# Altium schematic symbol library jlcpcb_2025_04_capacitors_extended_0603.schlib: 3668 symbols (part 7 of 20) (continued)
## C1608NP0100JGTS
designator C?  Capacitance: 10pF  (hidden comment: *)
Capacitor, Ceramic (MLCC), 10pF, ±5%, 50V, NP0, ±5%, SMD 0603; Manufacturer: Darfon Elec; Manufacturer Part Number: C1608NP0100JGTS; Package Size: 0603; JLCPCB Basic Part: No; JLCPCB Part Number: C718539; Supplier 1: LCSC; Category: Capacitors - MLCC; Supplier Part Number 1: C718539; Tolerance: ±5%; Voltage Rating: 50V; Temperature Coefficient: NP0; RoHS: Yes; ComponentLink1Description: Datasheet; ComponentLink1URL: https://wmsc.lcsc.com/wmsc/upload/file/pdf/v2/lcsc/2304140030_Darfon-Elec-C1608NP0100JGTS_C718539.pdf; ComponentLink2Description: JLCPCB Part URL; ComponentLink2URL: https://jlcpcb.com/partdetail/C718539; ComponentLink3Description: LCSC Part URL; ComponentLink3URL: https://lcsc.com/product-detail/Multilayer-Ceramic-Capacitors-MLCC---SMD-SMT_Darfon-Elec-Darfon-Elec-C1608NP0100JGTS_C718539.html
footprint CAP-0603 (0603 (1608M) Capacitor)
pins: 1, 2

## C1608NP0102JHTS
designator C?  Capacitance: 1nF  (hidden comment: *)
Capacitor, Ceramic (MLCC), 1nF, ±5%, 100V, NP0, ±5%, SMD 0603; Manufacturer: Darfon Elec; Manufacturer Part Number: C1608NP0102JHTS; Package Size: 0603; JLCPCB Basic Part: No; JLCPCB Part Number: C725590; Supplier 1: LCSC; Category: Capacitors - MLCC; Supplier Part Number 1: C725590; Tolerance: ±5%; Voltage Rating: 100V; Temperature Coefficient: NP0; RoHS: Yes; ComponentLink1Description: Datasheet; ComponentLink1URL: https://wmsc.lcsc.com/wmsc/upload/file/pdf/v2/lcsc/2304140030_Darfon-Elec-C1608NP0102JHTS_C725590.pdf; ComponentLink2Description: JLCPCB Part URL; ComponentLink2URL: https://jlcpcb.com/partdetail/C725590; ComponentLink3Description: LCSC Part URL; ComponentLink3URL: https://lcsc.com/product-detail/Multilayer-Ceramic-Capacitors-MLCC---SMD-SMT_Darfon-Elec-Darfon-Elec-C1608NP0102JHTS_C725590.html
footprint CAP-0603 (0603 (1608M) Capacitor)
pins: 1, 2

## C1608NP0120JGTS
designator C?  Capacitance: 12pF  (hidden comment: *)
Capacitor, Ceramic (MLCC), 12pF, ±5%, 50V, NP0, ±5%, SMD 0603; Manufacturer: Darfon Elec; Manufacturer Part Number: C1608NP0120JGTS; Package Size: 0603; JLCPCB Basic Part: No; JLCPCB Part Number: C718564; Supplier 1: LCSC; Category: Capacitors - MLCC; Supplier Part Number 1: C718564; Tolerance: ±5%; Voltage Rating: 50V; Temperature Coefficient: NP0; RoHS: Yes; ComponentLink1Description: Datasheet; ComponentLink1URL: https://wmsc.lcsc.com/wmsc/upload/file/pdf/v2/lcsc/2304140030_Darfon-Elec-C1608NP0120JGTS_C718564.pdf; ComponentLink2Description: JLCPCB Part URL; ComponentLink2URL: https://jlcpcb.com/partdetail/C718564; ComponentLink3Description: LCSC Part URL; ComponentLink3URL: https://lcsc.com/product-detail/Multilayer-Ceramic-Capacitors-MLCC---SMD-SMT_Darfon-Elec-Darfon-Elec-C1608NP0120JGTS_C718564.html
footprint CAP-0603 (0603 (1608M) Capacitor)
pins: 1, 2

## C1608NP0121JGTS
designator C?  Capacitance: 120pF  (hidden comment: *)
Capacitor, Ceramic (MLCC), 120pF, ±5%, 50V, NP0, ±5%, SMD 0603; Manufacturer: Darfon Elec; Manufacturer Part Number: C1608NP0121JGTS; Package Size: 0603; JLCPCB Basic Part: No; JLCPCB Part Number: C561174; Supplier 1: LCSC; Category: Capacitors - MLCC; Supplier Part Number 1: C561174; Tolerance: ±5%; Voltage Rating: 50V; Temperature Coefficient: NP0; RoHS: Yes; ComponentLink1Description: Datasheet; ComponentLink1URL: https://wmsc.lcsc.com/wmsc/upload/file/pdf/v2/lcsc/2006011904_Darfon-Elec-C1608NP0121JGTS_C561174.pdf; ComponentLink2Description: JLCPCB Part URL; ComponentLink2URL: https://jlcpcb.com/partdetail/C561174; ComponentLink3Description: LCSC Part URL; ComponentLink3URL: https://lcsc.com/product-detail/Multilayer-Ceramic-Capacitors-MLCC---SMD-SMT_Darfon-Elec-Darfon-Elec-C1608NP0121JGTS_C561174.html
footprint CAP-0603 (0603 (1608M) Capacitor)
pins: 1, 2

## C1608NP0122JGT
designator C?  Capacitance: 1.2nF  (hidden comment: *)
Capacitor, Ceramic (MLCC), 1.2nF, ±5%, 50V, NP0, ±5%, SMD 0603; Manufacturer: Darfon Elec; Manufacturer Part Number: C1608NP0122JGT; Package Size: 0603; JLCPCB Basic Part: No; JLCPCB Part Number: C359297; Supplier 1: LCSC; Category: Capacitors - MLCC; Supplier Part Number 1: C359297; Tolerance: ±5%; Voltage Rating: 50V; Temperature Coefficient: NP0; RoHS: Yes; ComponentLink1Description: Datasheet; ComponentLink1URL: https://wmsc.lcsc.com/wmsc/upload/file/pdf/v2/lcsc/2304140030_Darfon-Elec-C1608NP0122JGT_C359297.pdf; ComponentLink2Description: JLCPCB Part URL; ComponentLink2URL: https://jlcpcb.com/partdetail/C359297; ComponentLink3Description: LCSC Part URL; ComponentLink3URL: https://lcsc.com/product-detail/Multilayer-Ceramic-Capacitors-MLCC---SMD-SMT_Darfon-Elec-Darfon-Elec-C1608NP0122JGT_C359297.html
footprint CAP-0603 (0603 (1608M) Capacitor)
pins: 1, 2

## C1608NP0129CGTS
designator C?  Capacitance: 1.2pF  (hidden comment: *)
Capacitor, Ceramic (MLCC), 1.2pF, 50V, NP0, SMD 0603; Manufacturer: Darfon Elec; Manufacturer Part Number: C1608NP0129CGTS; Package Size: 0603; JLCPCB Basic Part: No; JLCPCB Part Number: C561161; Supplier 1: LCSC; Category: Capacitors - MLCC; Supplier Part Number 1: C561161; Voltage Rating: 50V; Temperature Coefficient: NP0; RoHS: Yes; ComponentLink1Description: Datasheet; ComponentLink1URL: https://wmsc.lcsc.com/wmsc/upload/file/pdf/v2/lcsc/2304140030_Darfon-Elec-C1608NP0129CGTS_C561161.pdf; ComponentLink2Description: JLCPCB Part URL; ComponentLink2URL: https://jlcpcb.com/partdetail/C561161; ComponentLink3Description: LCSC Part URL; ComponentLink3URL: https://lcsc.com/product-detail/Multilayer-Ceramic-Capacitors-MLCC---SMD-SMT_Darfon-Elec-Darfon-Elec-C1608NP0129CGTS_C561161.html
footprint CAP-0603 (0603 (1608M) Capacitor)
pins: 1, 2

## C1608NP0180JGTS
designator C?  Capacitance: 18pF  (hidden comment: *)
Capacitor, Ceramic (MLCC), 18pF, ±5%, 50V, NP0, ±5%, SMD 0603; Manufacturer: Darfon Elec; Manufacturer Part Number: C1608NP0180JGTS; Package Size: 0603; JLCPCB Basic Part: No; JLCPCB Part Number: C561171; Supplier 1: LCSC; Category: Capacitors - MLCC; Supplier Part Number 1: C561171; Tolerance: ±5%; Voltage Rating: 50V; Temperature Coefficient: NP0; RoHS: Yes; ComponentLink1Description: Datasheet; ComponentLink1URL: https://wmsc.lcsc.com/wmsc/upload/file/pdf/v2/lcsc/2006011904_Darfon-Elec-C1608NP0180JGTS_C561171.pdf; ComponentLink2Description: JLCPCB Part URL; ComponentLink2URL: https://jlcpcb.com/partdetail/C561171; ComponentLink3Description: LCSC Part URL; ComponentLink3URL: https://lcsc.com/product-detail/Multilayer-Ceramic-Capacitors-MLCC---SMD-SMT_Darfon-Elec-Darfon-Elec-C1608NP0180JGTS_C561171.html
footprint CAP-0603 (0603 (1608M) Capacitor)
pins: 1, 2

## C1608NP0189CGTS
designator C?  Capacitance: 1.8pF  (hidden comment: *)
Capacitor, Ceramic (MLCC), 1.8pF, 50V, NP0, SMD 0603; Manufacturer: Darfon Elec; Manufacturer Part Number: C1608NP0189CGTS; Package Size: 0603; JLCPCB Basic Part: No; JLCPCB Part Number: C561162; Supplier 1: LCSC; Category: Capacitors - MLCC; Supplier Part Number 1: C561162; Voltage Rating: 50V; Temperature Coefficient: NP0; RoHS: Yes; ComponentLink1Description: Datasheet; ComponentLink1URL: https://wmsc.lcsc.com/wmsc/upload/file/pdf/v2/lcsc/2304140030_Darfon-Elec-C1608NP0189CGTS_C561162.pdf; ComponentLink2Description: JLCPCB Part URL; ComponentLink2URL: https://jlcpcb.com/partdetail/C561162; ComponentLink3Description: LCSC Part URL; ComponentLink3URL: https://lcsc.com/product-detail/Multilayer-Ceramic-Capacitors-MLCC---SMD-SMT_Darfon-Elec-Darfon-Elec-C1608NP0189CGTS_C561162.html
footprint CAP-0603 (0603 (1608M) Capacitor)
pins: 1, 2

## C1608NP0220JGTS
designator C?  Capacitance: 22pF  (hidden comment: *)
Capacitor, Ceramic (MLCC), 22pF, ±5%, 50V, NP0, ±5%, SMD 0603; Manufacturer: Darfon Elec; Manufacturer Part Number: C1608NP0220JGTS; Package Size: 0603; JLCPCB Basic Part: No; JLCPCB Part Number: C561172; Supplier 1: LCSC; Category: Capacitors - MLCC; Supplier Part Number 1: C561172; Tolerance: ±5%; Voltage Rating: 50V; Temperature Coefficient: NP0; RoHS: Yes; ComponentLink1Description: Datasheet; ComponentLink1URL: https://wmsc.lcsc.com/wmsc/upload/file/pdf/v2/lcsc/2006011904_Darfon-Elec-C1608NP0220JGTS_C561172.pdf; ComponentLink2Description: JLCPCB Part URL; ComponentLink2URL: https://jlcpcb.com/partdetail/C561172; ComponentLink3Description: LCSC Part URL; ComponentLink3URL: https://lcsc.com/product-detail/Multilayer-Ceramic-Capacitors-MLCC---SMD-SMT_Darfon-Elec-Darfon-Elec-C1608NP0220JGTS_C561172.html
footprint CAP-0603 (0603 (1608M) Capacitor)
pins: 1, 2

## C1608NP0249CGTS
designator C?  Capacitance: 2.4pF  (hidden comment: *)
Capacitor, Ceramic (MLCC), 2.4pF, 50V, NP0, SMD 0603; Manufacturer: Darfon Elec; Manufacturer Part Number: C1608NP0249CGTS; Package Size: 0603; JLCPCB Basic Part: No; JLCPCB Part Number: C561163; Supplier 1: LCSC; Category: Capacitors - MLCC; Supplier Part Number 1: C561163; Voltage Rating: 50V; Temperature Coefficient: NP0; RoHS: Yes; ComponentLink1Description: Datasheet; ComponentLink1URL: https://wmsc.lcsc.com/wmsc/upload/file/pdf/v2/lcsc/2304140030_Darfon-Elec-C1608NP0249CGTS_C561163.pdf; ComponentLink2Description: JLCPCB Part URL; ComponentLink2URL: https://jlcpcb.com/partdetail/C561163; ComponentLink3Description: LCSC Part URL; ComponentLink3URL: https://lcsc.com/product-detail/Multilayer-Ceramic-Capacitors-MLCC---SMD-SMT_Darfon-Elec-Darfon-Elec-C1608NP0249CGTS_C561163.html
footprint CAP-0603 (0603 (1608M) Capacitor)
pins: 1, 2

## C1608NP0330JGTS
designator C?  Capacitance: 33pF  (hidden comment: *)
Capacitor, Ceramic (MLCC), 33pF, ±5%, 50V, NP0, ±5%, SMD 0603; Manufacturer: Darfon Elec; Manufacturer Part Number: C1608NP0330JGTS; Package Size: 0603; JLCPCB Basic Part: No; JLCPCB Part Number: C561173; Supplier 1: LCSC; Category: Capacitors - MLCC; Supplier Part Number 1: C561173; Tolerance: ±5%; Voltage Rating: 50V; Temperature Coefficient: NP0; RoHS: Yes; ComponentLink1Description: Datasheet; ComponentLink1URL: https://wmsc.lcsc.com/wmsc/upload/file/pdf/v2/lcsc/2006011904_Darfon-Elec-C1608NP0330JGTS_C561173.pdf; ComponentLink2Description: JLCPCB Part URL; ComponentLink2URL: https://jlcpcb.com/partdetail/C561173; ComponentLink3Description: LCSC Part URL; ComponentLink3URL: https://lcsc.com/product-detail/Multilayer-Ceramic-Capacitors-MLCC---SMD-SMT_Darfon-Elec-Darfon-Elec-C1608NP0330JGTS_C561173.html
footprint CAP-0603 (0603 (1608M) Capacitor)
pins: 1, 2

## C1608NP0339CGTS
designator C?  Capacitance: 3.3pF  (hidden comment: *)
Capacitor, Ceramic (MLCC), 3.3pF, 50V, NP0, SMD 0603; Manufacturer: Darfon Elec; Manufacturer Part Number: C1608NP0339CGTS; Package Size: 0603; JLCPCB Basic Part: No; JLCPCB Part Number: C561165; Supplier 1: LCSC; Category: Capacitors - MLCC; Supplier Part Number 1: C561165; Voltage Rating: 50V; Temperature Coefficient: NP0; RoHS: Yes; ComponentLink1Description: Datasheet; ComponentLink1URL: https://wmsc.lcsc.com/wmsc/upload/file/pdf/v2/lcsc/2304140030_Darfon-Elec-C1608NP0339CGTS_C561165.pdf; ComponentLink2Description: JLCPCB Part URL; ComponentLink2URL: https://jlcpcb.com/partdetail/C561165; ComponentLink3Description: LCSC Part URL; ComponentLink3URL: https://lcsc.com/product-detail/Multilayer-Ceramic-Capacitors-MLCC---SMD-SMT_Darfon-Elec-Darfon-Elec-C1608NP0339CGTS_C561165.html
footprint CAP-0603 (0603 (1608M) Capacitor)
pins: 1, 2

## C1608NP0399CGTS
designator C?  Capacitance: 3.9pF  (hidden comment: *)
Capacitor, Ceramic (MLCC), 3.9pF, 50V, NP0, SMD 0603; Manufacturer: Darfon Elec; Manufacturer Part Number: C1608NP0399CGTS; Package Size: 0603; JLCPCB Basic Part: No; JLCPCB Part Number: C561166; Supplier 1: LCSC; Category: Capacitors - MLCC; Supplier Part Number 1: C561166; Voltage Rating: 50V; Temperature Coefficient: NP0; RoHS: Yes; ComponentLink1Description: Datasheet; ComponentLink1URL: https://wmsc.lcsc.com/wmsc/upload/file/pdf/v2/lcsc/2304140030_Darfon-Elec-C1608NP0399CGTS_C561166.pdf; ComponentLink2Description: JLCPCB Part URL; ComponentLink2URL: https://jlcpcb.com/partdetail/C561166; ComponentLink3Description: LCSC Part URL; ComponentLink3URL: https://lcsc.com/product-detail/Multilayer-Ceramic-Capacitors-MLCC---SMD-SMT_Darfon-Elec-Darfon-Elec-C1608NP0399CGTS_C561166.html
footprint CAP-0603 (0603 (1608M) Capacitor)
pins: 1, 2

## C1608NP0470JGTS
designator C?  Capacitance: 47pF  (hidden comment: *)
Capacitor, Ceramic (MLCC), 47pF, ±5%, 50V, NP0, ±5%, SMD 0603; Manufacturer: Darfon Elec; Manufacturer Part Number: C1608NP0470JGTS; Package Size: 0603; JLCPCB Basic Part: No; JLCPCB Part Number: C725574; Supplier 1: LCSC; Category: Capacitors - MLCC; Supplier Part Number 1: C725574; Tolerance: ±5%; Voltage Rating: 50V; Temperature Coefficient: NP0; RoHS: Yes; ComponentLink1Description: Datasheet; ComponentLink1URL: https://wmsc.lcsc.com/wmsc/upload/file/pdf/v2/lcsc/2304140030_Darfon-Elec-C1608NP0470JGTS_C725574.pdf; ComponentLink2Description: JLCPCB Part URL; ComponentLink2URL: https://jlcpcb.com/partdetail/C725574; ComponentLink3Description: LCSC Part URL; ComponentLink3URL: https://lcsc.com/product-detail/Multilayer-Ceramic-Capacitors-MLCC---SMD-SMT_Darfon-Elec-Darfon-Elec-C1608NP0470JGTS_C725574.html
footprint CAP-0603 (0603 (1608M) Capacitor)
pins: 1, 2

## C1608NP0509DGTS
designator C?  Capacitance: 5pF  (hidden comment: *)
Capacitor, Ceramic (MLCC), 5pF, 50V, NP0, SMD 0603; Manufacturer: Darfon Elec; Manufacturer Part Number: C1608NP0509DGTS; Package Size: 0603; JLCPCB Basic Part: No; JLCPCB Part Number: C561167; Supplier 1: LCSC; Category: Capacitors - MLCC; Supplier Part Number 1: C561167; Voltage Rating: 50V; Temperature Coefficient: NP0; RoHS: Yes; ComponentLink1Description: Datasheet; ComponentLink1URL: https://wmsc.lcsc.com/wmsc/upload/file/pdf/v2/lcsc/2006011904_Darfon-Elec-C1608NP0509DGTS_C561167.pdf; ComponentLink2Description: JLCPCB Part URL; ComponentLink2URL: https://jlcpcb.com/partdetail/C561167; ComponentLink3Description: LCSC Part URL; ComponentLink3URL: https://lcsc.com/product-detail/Multilayer-Ceramic-Capacitors-MLCC---SMD-SMT_Darfon-Elec-Darfon-Elec-C1608NP0509DGTS_C561167.html
footprint CAP-0603 (0603 (1608M) Capacitor)
pins: 1, 2

## C1608NP0569DGTS
designator C?  Capacitance: 5.6pF  (hidden comment: *)
Capacitor, Ceramic (MLCC), 5.6pF, 50V, NP0, SMD 0603; Manufacturer: Darfon Elec; Manufacturer Part Number: C1608NP0569DGTS; Package Size: 0603; JLCPCB Basic Part: No; JLCPCB Part Number: C561168; Supplier 1: LCSC; Category: Capacitors - MLCC; Supplier Part Number 1: C561168; Voltage Rating: 50V; Temperature Coefficient: NP0; RoHS: Yes; ComponentLink1Description: Datasheet; ComponentLink1URL: https://wmsc.lcsc.com/wmsc/upload/file/pdf/v2/lcsc/2006011904_Darfon-Elec-C1608NP0569DGTS_C561168.pdf; ComponentLink2Description: JLCPCB Part URL; ComponentLink2URL: https://jlcpcb.com/partdetail/C561168; ComponentLink3Description: LCSC Part URL; ComponentLink3URL: https://lcsc.com/product-detail/Multilayer-Ceramic-Capacitors-MLCC---SMD-SMT_Darfon-Elec-Darfon-Elec-C1608NP0569DGTS_C561168.html
footprint CAP-0603 (0603 (1608M) Capacitor)
pins: 1, 2

## C1608NP0681JGT
designator C?  Capacitance: 680pF  (hidden comment: *)
Capacitor, Ceramic (MLCC), 680pF, ±5%, 50V, NP0, ±5%, SMD 0603; Manufacturer: Darfon Elec; Manufacturer Part Number: C1608NP0681JGT; Package Size: 0603; JLCPCB Basic Part: No; JLCPCB Part Number: C359306; Supplier 1: LCSC; Category: Capacitors - MLCC; Supplier Part Number 1: C359306; Tolerance: ±5%; Voltage Rating: 50V; Temperature Coefficient: NP0; RoHS: Yes; ComponentLink1Description: Datasheet; ComponentLink1URL: https://wmsc.lcsc.com/wmsc/upload/file/pdf/v2/lcsc/2304140030_Darfon-Elec-C1608NP0681JGT_C359306.pdf; ComponentLink2Description: JLCPCB Part URL; ComponentLink2URL: https://jlcpcb.com/partdetail/C359306; ComponentLink3Description: LCSC Part URL; ComponentLink3URL: https://lcsc.com/product-detail/Multilayer-Ceramic-Capacitors-MLCC---SMD-SMT_Darfon-Elec-Darfon-Elec-C1608NP0681JGT_C359306.html
footprint CAP-0603 (0603 (1608M) Capacitor)
pins: 1, 2

## C1608X5R0G156MT000N
designator C?  Capacitance: 15uF  (hidden comment: *)
Capacitor, Ceramic (MLCC), 15uF, ±20%, 4V, X5R, ±20%, SMD 0603; Manufacturer: TDK; Manufacturer Part Number: C1608X5R0G156MT000N; Package Size: 0603; JLCPCB Basic Part: No; JLCPCB Part Number: C695359; Supplier 1: LCSC; Category: Capacitors - MLCC; Supplier Part Number 1: C695359; Tolerance: ±20%; Voltage Rating: 4V; Temperature Coefficient: X5R; RoHS: Yes; ComponentLink1Description: Datasheet; ComponentLink1URL: https://wmsc.lcsc.com/wmsc/upload/file/pdf/v2/lcsc/2010141133_TDK-C1608X5R0G156MT000N_C695359.pdf; ComponentLink2Description: JLCPCB Part URL; ComponentLink2URL: https://jlcpcb.com/partdetail/C695359; ComponentLink3Description: LCSC Part URL; ComponentLink3URL: https://lcsc.com/product-detail/Multilayer-Ceramic-Capacitors-MLCC---SMD-SMT_TDK-TDK-C1608X5R0G156MT000N_C695359.html
footprint CAP-0603 (0603 (1608M) Capacitor)
pins: 1, 2

## C1608X5R0J106KTJ00N
designator C?  Capacitance: 10uF  (hidden comment: *)
Capacitor, Ceramic (MLCC), 10uF, ±10%, 6.3V, X5R, ±10%, SMD 0603; Manufacturer: TDK; Manufacturer Part Number: C1608X5R0J106KTJ00N; Package Size: 0603; JLCPCB Basic Part: No; JLCPCB Part Number: C329937; Supplier 1: LCSC; Category: Capacitors - MLCC; Supplier Part Number 1: C329937; Tolerance: ±10%; Voltage Rating: 6.3V; Temperature Coefficient: X5R; RoHS: Yes; ComponentLink1Description: Datasheet; ComponentLink1URL: https://wmsc.lcsc.com/wmsc/upload/file/pdf/v2/lcsc/2304140030_TDK-C1608X5R0J106KTJ00N_C329937.pdf; ComponentLink2Description: JLCPCB Part URL; ComponentLink2URL: https://jlcpcb.com/partdetail/C329937; ComponentLink3Description: LCSC Part URL; ComponentLink3URL: https://lcsc.com/product-detail/Multilayer-Ceramic-Capacitors-MLCC---SMD-SMT_TDK-TDK-C1608X5R0J106KTJ00N_C329937.html
footprint CAP-0603 (0603 (1608M) Capacitor)
pins: 1, 2

## C1608X5R0J106MTJ00N
designator C?  Capacitance: 10uF  (hidden comment: *)
Capacitor, Ceramic (MLCC), 10uF, ±20%, 6.3V, X5R, ±20%, SMD 0603; Manufacturer: TDK; Manufacturer Part Number: C1608X5R0J106MTJ00N; Package Size: 0603; JLCPCB Basic Part: No; JLCPCB Part Number: C329938; Supplier 1: LCSC; Category: Capacitors - MLCC; Supplier Part Number 1: C329938; Tolerance: ±20%; Voltage Rating: 6.3V; Temperature Coefficient: X5R; RoHS: Yes; ComponentLink1Description: Datasheet; ComponentLink1URL: https://wmsc.lcsc.com/wmsc/upload/file/pdf/v2/lcsc/2304140030_TDK-C1608X5R0J106MTJ00N_C329938.pdf; ComponentLink2Description: JLCPCB Part URL; ComponentLink2URL: https://jlcpcb.com/partdetail/C329938; ComponentLink3Description: LCSC Part URL; ComponentLink3URL: https://lcsc.com/product-detail/Multilayer-Ceramic-Capacitors-MLCC---SMD-SMT_TDK-TDK-C1608X5R0J106MTJ00N_C329938.html
footprint CAP-0603 (0603 (1608M) Capacitor)
pins: 1, 2

## C1608X5R0J156MT000E
designator C?  Capacitance: 15uF  (hidden comment: *)
Capacitor, Ceramic (MLCC), 15uF, ±20%, 6.3V, X5R, ±20%, SMD 0603; Manufacturer: TDK; Manufacturer Part Number: C1608X5R0J156MT000E; Package Size: 0603; JLCPCB Basic Part: No; JLCPCB Part Number: C445715; Supplier 1: LCSC; Category: Capacitors - MLCC; Supplier Part Number 1: C445715; Tolerance: ±20%; Voltage Rating: 6.3V; Temperature Coefficient: X5R; RoHS: Yes; ComponentLink1Description: Datasheet; ComponentLink1URL: https://wmsc.lcsc.com/wmsc/upload/file/pdf/v2/lcsc/2304140030_TDK-C1608X5R0J156MT000E_C445715.pdf; ComponentLink2Description: JLCPCB Part URL; ComponentLink2URL: https://jlcpcb.com/partdetail/C445715; ComponentLink3Description: LCSC Part URL; ComponentLink3URL: https://lcsc.com/product-detail/Multilayer-Ceramic-Capacitors-MLCC---SMD-SMT_TDK-TDK-C1608X5R0J156MT000E_C445715.html
footprint CAP-0603 (0603 (1608M) Capacitor)
pins: 1, 2

## C1608X5R0J226MT000E
designator C?  Capacitance: 22uF  (hidden comment: *)
Capacitor, Ceramic (MLCC), 22uF, ±20%, 6.3V, X5R, ±20%, SMD 0603; Manufacturer: TDK; Manufacturer Part Number: C1608X5R0J226MT000E; Package Size: 0603; JLCPCB Basic Part: No; JLCPCB Part Number: C342829; Supplier 1: LCSC; Category: Capacitors - MLCC; Supplier Part Number 1: C342829; Tolerance: ±20%; Voltage Rating: 6.3V; Temperature Coefficient: X5R; RoHS: Yes; ComponentLink1Description: Datasheet; ComponentLink1URL: https://wmsc.lcsc.com/wmsc/upload/file/pdf/v2/lcsc/2304140030_TDK-C1608X5R0J226MT000E_C342829.pdf; ComponentLink2Description: JLCPCB Part URL; ComponentLink2URL: https://jlcpcb.com/partdetail/C342829; ComponentLink3Description: LCSC Part URL; ComponentLink3URL: https://lcsc.com/product-detail/Multilayer-Ceramic-Capacitors-MLCC---SMD-SMT_TDK-TDK-C1608X5R0J226MT000E_C342829.html
footprint CAP-0603 (0603 (1608M) Capacitor)
pins: 1, 2

## C1608X5R1A105KT000E
designator C?  Capacitance: 1uF  (hidden comment: *)
Capacitor, Ceramic (MLCC), 1uF, ±10%, 10V, X5R, ±10%, SMD 0603; Manufacturer: TDK; Manufacturer Part Number: C1608X5R1A105KT000E; Package Size: 0603; JLCPCB Basic Part: No; JLCPCB Part Number: C695137; Supplier 1: LCSC; Category: Capacitors - MLCC; Supplier Part Number 1: C695137; Tolerance: ±10%; Voltage Rating: 10V; Temperature Coefficient: X5R; RoHS: Yes; ComponentLink1Description: Datasheet; ComponentLink1URL: https://wmsc.lcsc.com/wmsc/upload/file/pdf/v2/lcsc/2304140030_TDK-C1608X5R1A105KT000E_C695137.pdf; ComponentLink2Description: JLCPCB Part URL; ComponentLink2URL: https://jlcpcb.com/partdetail/C695137; ComponentLink3Description: LCSC Part URL; ComponentLink3URL: https://lcsc.com/product-detail/Multilayer-Ceramic-Capacitors-MLCC---SMD-SMT_TDK-TDK-C1608X5R1A105KT000E_C695137.html
footprint CAP-0603 (0603 (1608M) Capacitor)
pins: 1, 2

## C1608X5R1A106KT000E
designator C?  Capacitance: 10uF  (hidden comment: *)
Capacitor, Ceramic (MLCC), 10uF, ±10%, 10V, X5R, ±10%, SMD 0603; Manufacturer: TDK; Manufacturer Part Number: C1608X5R1A106KT000E; Package Size: 0603; JLCPCB Basic Part: No; JLCPCB Part Number: C76608; Supplier 1: LCSC; Category: Capacitors - MLCC; Supplier Part Number 1: C76608; Tolerance: ±10%; Voltage Rating: 10V; Temperature Coefficient: X5R; RoHS: Yes; ComponentLink1Description: Datasheet; ComponentLink1URL: https://wmsc.lcsc.com/wmsc/upload/file/pdf/v2/lcsc/2304140030_TDK-C1608X5R1A106KT000E_C76608.pdf; ComponentLink2Description: JLCPCB Part URL; ComponentLink2URL: https://jlcpcb.com/partdetail/C76608; ComponentLink3Description: LCSC Part URL; ComponentLink3URL: https://lcsc.com/product-detail/Multilayer-Ceramic-Capacitors-MLCC---SMD-SMT_TDK-TDK-C1608X5R1A106KT000E_C76608.html
footprint CAP-0603 (0603 (1608M) Capacitor)
pins: 1, 2

## C1608X5R1A106MT000E
designator C?  Capacitance: 10uF  (hidden comment: *)
Capacitor, Ceramic (MLCC), 10uF, ±20%, 10V, X5R, ±20%, SMD 0603; Manufacturer: TDK; Manufacturer Part Number: C1608X5R1A106MT000E; Package Size: 0603; JLCPCB Basic Part: No; JLCPCB Part Number: C76609; Supplier 1: LCSC; Category: Capacitors - MLCC; Supplier Part Number 1: C76609; Tolerance: ±20%; Voltage Rating: 10V; Temperature Coefficient: X5R; RoHS: Yes; ComponentLink1Description: Datasheet; ComponentLink1URL: https://wmsc.lcsc.com/wmsc/upload/file/pdf/v2/lcsc/2304140030_TDK-C1608X5R1A106MT000E_C76609.pdf; ComponentLink2Description: JLCPCB Part URL; ComponentLink2URL: https://jlcpcb.com/partdetail/C76609; ComponentLink3Description: LCSC Part URL; ComponentLink3URL: https://lcsc.com/product-detail/Multilayer-Ceramic-Capacitors-MLCC---SMD-SMT_TDK-TDK-C1608X5R1A106MT000E_C76609.html
footprint CAP-0603 (0603 (1608M) Capacitor)
pins: 1, 2

## C1608X5R1A226MT000E
designator C?  Capacitance: 22uF  (hidden comment: *)
Capacitor, Ceramic (MLCC), 22uF, ±20%, 10V, X5R, ±20%, SMD 0603; Manufacturer: TDK; Manufacturer Part Number: C1608X5R1A226MT000E; Package Size: 0603; JLCPCB Basic Part: No; JLCPCB Part Number: C342824; Supplier 1: LCSC; Category: Capacitors - MLCC; Supplier Part Number 1: C342824; Tolerance: ±20%; Voltage Rating: 10V; Temperature Coefficient: X5R; RoHS: Yes; ComponentLink1Description: Datasheet; ComponentLink2Description: JLCPCB Part URL; ComponentLink2URL: https://jlcpcb.com/partdetail/C342824; ComponentLink3Description: LCSC Part URL; ComponentLink3URL: https://lcsc.com/product-detail/Multilayer-Ceramic-Capacitors-MLCC---SMD-SMT_TDK-TDK-C1608X5R1A226MT000E_C342824.html
footprint CAP-0603 (0603 (1608M) Capacitor)
pins: 1, 2

## C1608X5R1A475KT000N
designator C?  Capacitance: 4.7uF  (hidden comment: *)
Capacitor, Ceramic (MLCC), 4.7uF, ±10%, 10V, X5R, ±10%, SMD 0603; Manufacturer: TDK; Manufacturer Part Number: C1608X5R1A475KT000N; Package Size: 0603; JLCPCB Basic Part: No; JLCPCB Part Number: C338003; Supplier 1: LCSC; Category: Capacitors - MLCC; Supplier Part Number 1: C338003; Tolerance: ±10%; Voltage Rating: 10V; Temperature Coefficient: X5R; RoHS: Yes; ComponentLink1Description: Datasheet; ComponentLink1URL: https://wmsc.lcsc.com/wmsc/upload/file/pdf/v2/lcsc/2304140030_TDK-C1608X5R1A475KT000N_C338003.pdf; ComponentLink2Description: JLCPCB Part URL; ComponentLink2URL: https://jlcpcb.com/partdetail/C338003; ComponentLink3Description: LCSC Part URL; ComponentLink3URL: https://lcsc.com/product-detail/Multilayer-Ceramic-Capacitors-MLCC---SMD-SMT_TDK-TDK-C1608X5R1A475KT000N_C338003.html
footprint CAP-0603 (0603 (1608M) Capacitor)
pins: 1, 2

## C1608X5R1A685KT000E
designator C?  Capacitance: 6.8uF  (hidden comment: *)
Capacitor, Ceramic (MLCC), 6.8uF, ±10%, 10V, X5R, ±10%, SMD 0603; Manufacturer: TDK; Manufacturer Part Number: C1608X5R1A685KT000E; Package Size: 0603; JLCPCB Basic Part: No; JLCPCB Part Number: C338096; Supplier 1: LCSC; Category: Capacitors - MLCC; Supplier Part Number 1: C338096; Tolerance: ±10%; Voltage Rating: 10V; Temperature Coefficient: X5R; RoHS: Yes; ComponentLink1Description: Datasheet; ComponentLink1URL: https://wmsc.lcsc.com/wmsc/upload/file/pdf/v2/lcsc/2304140030_TDK-C1608X5R1A685KT000E_C338096.pdf; ComponentLink2Description: JLCPCB Part URL; ComponentLink2URL: https://jlcpcb.com/partdetail/C338096; ComponentLink3Description: LCSC Part URL; ComponentLink3URL: https://lcsc.com/product-detail/Multilayer-Ceramic-Capacitors-MLCC---SMD-SMT_TDK-TDK-C1608X5R1A685KT000E_C338096.html
footprint CAP-0603 (0603 (1608M) Capacitor)
pins: 1, 2

## C1608X5R1C105KT000N
designator C?  Capacitance: 1uF  (hidden comment: *)
Capacitor, Ceramic (MLCC), 1uF, ±10%, 16V, X5R, ±10%, SMD 0603; Manufacturer: TDK; Manufacturer Part Number: C1608X5R1C105KT000N; Package Size: 0603; JLCPCB Basic Part: No; JLCPCB Part Number: C76611; Supplier 1: LCSC; Category: Capacitors - MLCC; Supplier Part Number 1: C76611; Tolerance: ±10%; Voltage Rating: 16V; Temperature Coefficient: X5R; RoHS: Yes; ComponentLink1Description: Datasheet; ComponentLink1URL: https://wmsc.lcsc.com/wmsc/upload/file/pdf/v2/lcsc/2304140030_TDK-C1608X5R1C105KT000N_C76611.pdf; ComponentLink2Description: JLCPCB Part URL; ComponentLink2URL: https://jlcpcb.com/partdetail/C76611; ComponentLink3Description: LCSC Part URL; ComponentLink3URL: https://lcsc.com/product-detail/Multilayer-Ceramic-Capacitors-MLCC---SMD-SMT_TDK-TDK-C1608X5R1C105KT000N_C76611.html
footprint CAP-0603 (0603 (1608M) Capacitor)
pins: 1, 2

## C1608X5R1C106MT000N
designator C?  Capacitance: 10uF  (hidden comment: *)
Capacitor, Ceramic (MLCC), 10uF, ±20%, 16V, X5R, ±20%, SMD 0603; Manufacturer: TDK; Manufacturer Part Number: C1608X5R1C106MT000N; Package Size: 0603; JLCPCB Basic Part: No; JLCPCB Part Number: C342854; Supplier 1: LCSC; Category: Capacitors - MLCC; Supplier Part Number 1: C342854; Tolerance: ±20%; Voltage Rating: 16V; Temperature Coefficient: X5R; RoHS: Yes; ComponentLink1Description: Datasheet; ComponentLink1URL: https://wmsc.lcsc.com/wmsc/upload/file/pdf/v2/lcsc/2304140030_TDK-C1608X5R1C106MT000N_C342854.pdf; ComponentLink2Description: JLCPCB Part URL; ComponentLink2URL: https://jlcpcb.com/partdetail/C342854; ComponentLink3Description: LCSC Part URL; ComponentLink3URL: https://lcsc.com/product-detail/Multilayer-Ceramic-Capacitors-MLCC---SMD-SMT_TDK-TDK-C1608X5R1C106MT000N_C342854.html
footprint CAP-0603 (0603 (1608M) Capacitor)
pins: 1, 2

## C1608X5R1C225KT000N
designator C?  Capacitance: 2.2uF  (hidden comment: *)
Capacitor, Ceramic (MLCC), 2.2uF, ±10%, 16V, X5R, ±10%, SMD 0603; Manufacturer: TDK; Manufacturer Part Number: C1608X5R1C225KT000N; Package Size: 0603; JLCPCB Basic Part: No; JLCPCB Part Number: C76612; Supplier 1: LCSC; Category: Capacitors - MLCC; Supplier Part Number 1: C76612; Tolerance: ±10%; Voltage Rating: 16V; Temperature Coefficient: X5R; RoHS: Yes; ComponentLink1Description: Datasheet; ComponentLink1URL: https://wmsc.lcsc.com/wmsc/upload/file/pdf/v2/lcsc/2304140030_TDK-C1608X5R1C225KT000N_C76612.pdf; ComponentLink2Description: JLCPCB Part URL; ComponentLink2URL: https://jlcpcb.com/partdetail/C76612; ComponentLink3Description: LCSC Part URL; ComponentLink3URL: https://lcsc.com/product-detail/Multilayer-Ceramic-Capacitors-MLCC---SMD-SMT_TDK-TDK-C1608X5R1C225KT000N_C76612.html
footprint CAP-0603 (0603 (1608M) Capacitor)
pins: 1, 2

## C1608X5R1C334KT000N
designator C?  Capacitance: 330nF  (hidden comment: *)
Capacitor, Ceramic (MLCC), 330nF, ±10%, 16V, X5R, ±10%, SMD 0603; Manufacturer: TDK; Manufacturer Part Number: C1608X5R1C334KT000N; Package Size: 0603; JLCPCB Basic Part: No; JLCPCB Part Number: C338026; Supplier 1: LCSC; Category: Capacitors - MLCC; Supplier Part Number 1: C338026; Tolerance: ±10%; Voltage Rating: 16V; Temperature Coefficient: X5R; RoHS: Yes; ComponentLink1Description: Datasheet; ComponentLink1URL: https://wmsc.lcsc.com/wmsc/upload/file/pdf/v2/lcsc/2304140030_TDK-C1608X5R1C334KT000N_C338026.pdf; ComponentLink2Description: JLCPCB Part URL; ComponentLink2URL: https://jlcpcb.com/partdetail/C338026; ComponentLink3Description: LCSC Part URL; ComponentLink3URL: https://lcsc.com/product-detail/Multilayer-Ceramic-Capacitors-MLCC---SMD-SMT_TDK-TDK-C1608X5R1C334KT000N_C338026.html
footprint CAP-0603 (0603 (1608M) Capacitor)
pins: 1, 2

## C1608X5R1C475KTK00E
designator C?  Capacitance: 4.7uF  (hidden comment: *)
Capacitor, Ceramic (MLCC), 4.7uF, ±10%, 16V, X5R, ±10%, SMD 0603; Manufacturer: TDK; Manufacturer Part Number: C1608X5R1C475KTK00E; Package Size: 0603; JLCPCB Basic Part: No; JLCPCB Part Number: C342985; Supplier 1: LCSC; Category: Capacitors - MLCC; Supplier Part Number 1: C342985; Tolerance: ±10%; Voltage Rating: 16V; Temperature Coefficient: X5R; RoHS: Yes; ComponentLink1Description: Datasheet; ComponentLink1URL: https://wmsc.lcsc.com/wmsc/upload/file/pdf/v2/lcsc/2304140030_TDK-C1608X5R1C475KTK00E_C342985.pdf; ComponentLink2Description: JLCPCB Part URL; ComponentLink2URL: https://jlcpcb.com/partdetail/C342985; ComponentLink3Description: LCSC Part URL; ComponentLink3URL: https://lcsc.com/product-detail/Multilayer-Ceramic-Capacitors-MLCC---SMD-SMT_TDK-TDK-C1608X5R1C475KTK00E_C342985.html
footprint CAP-0603 (0603 (1608M) Capacitor)
pins: 1, 2

## C1608X5R1E105KT000E
designator C?  Capacitance: 1uF  (hidden comment: *)
Capacitor, Ceramic (MLCC), 1uF, ±10%, 25V, X5R, ±10%, SMD 0603; Manufacturer: TDK; Manufacturer Part Number: C1608X5R1E105KT000E; Package Size: 0603; JLCPCB Basic Part: No; JLCPCB Part Number: C329944; Supplier 1: LCSC; Category: Capacitors - MLCC; Supplier Part Number 1: C329944; Tolerance: ±10%; Voltage Rating: 25V; Temperature Coefficient: X5R; RoHS: Yes; ComponentLink1Description: Datasheet; ComponentLink1URL: https://wmsc.lcsc.com/wmsc/upload/file/pdf/v2/lcsc/2304140030_TDK-C1608X5R1E105KT000E_C329944.pdf; ComponentLink2Description: JLCPCB Part URL; ComponentLink2URL: https://jlcpcb.com/partdetail/C329944; ComponentLink3Description: LCSC Part URL; ComponentLink3URL: https://lcsc.com/product-detail/Multilayer-Ceramic-Capacitors-MLCC---SMD-SMT_TDK-TDK-C1608X5R1E105KT000E_C329944.html
footprint CAP-0603 (0603 (1608M) Capacitor)
pins: 1, 2

## C1608X5R1E106MT000E
designator C?  Capacitance: 10uF  (hidden comment: *)
Capacitor, Ceramic (MLCC), 10uF, ±20%, 25V, X5R, ±20%, SMD 0603; Manufacturer: TDK; Manufacturer Part Number: C1608X5R1E106MT000E; Package Size: 0603; JLCPCB Basic Part: No; JLCPCB Part Number: C76614; Supplier 1: LCSC; Category: Capacitors - MLCC; Supplier Part Number 1: C76614; Tolerance: ±20%; Voltage Rating: 25V; Temperature Coefficient: X5R; RoHS: Yes; ComponentLink1Description: Datasheet; ComponentLink1URL: https://wmsc.lcsc.com/wmsc/upload/file/pdf/v2/lcsc/2304140030_TDK-C1608X5R1E106MT000E_C76614.pdf; ComponentLink2Description: JLCPCB Part URL; ComponentLink2URL: https://jlcpcb.com/partdetail/C76614; ComponentLink3Description: LCSC Part URL; ComponentLink3URL: https://lcsc.com/product-detail/Multilayer-Ceramic-Capacitors-MLCC---SMD-SMT_TDK-TDK-C1608X5R1E106MT000E_C76614.html
footprint CAP-0603 (0603 (1608M) Capacitor)
pins: 1, 2

## C1608X5R1E225KT000S
designator C?  Capacitance: 2.2uF  (hidden comment: *)
Capacitor, Ceramic (MLCC), 2.2uF, 25V, X5R, SMD 0603; Manufacturer: TDK; Manufacturer Part Number: C1608X5R1E225KT000S; Package Size: 0603; JLCPCB Basic Part: No; JLCPCB Part Number: C2991827; Supplier 1: LCSC; Category: Capacitors - MLCC; Supplier Part Number 1: C2991827; Voltage Rating: 25V; Temperature Coefficient: X5R; RoHS: Yes; ComponentLink1Description: Datasheet; ComponentLink1URL: https://wmsc.lcsc.com/wmsc/upload/file/pdf/v2/lcsc/2204151015_TDK-C1608X5R1E225KT000S_C2991827.pdf; ComponentLink2Description: JLCPCB Part URL; ComponentLink2URL: https://jlcpcb.com/partdetail/C2991827; ComponentLink3Description: LCSC Part URL; ComponentLink3URL: https://lcsc.com/product-detail/Multilayer-Ceramic-Capacitors-MLCC---SMD-SMT_TDK-TDK-C1608X5R1E225KT000S_C2991827.html
footprint CAP-0603 (0603 (1608M) Capacitor)
pins: 1, 2

## C1608X5R1E225KTJ00N
designator C?  Capacitance: 2.2uF  (hidden comment: *)
Capacitor, Ceramic (MLCC), 2.2uF, ±10%, 25V, X5R, ±10%, SMD 0603; Manufacturer: TDK; Manufacturer Part Number: C1608X5R1E225KTJ00N; Package Size: 0603; JLCPCB Basic Part: No; JLCPCB Part Number: C342993; Supplier 1: LCSC; Category: Capacitors - MLCC; Supplier Part Number 1: C342993; Tolerance: ±10%; Voltage Rating: 25V; Temperature Coefficient: X5R; RoHS: Yes; ComponentLink1Description: Datasheet; ComponentLink1URL: https://wmsc.lcsc.com/wmsc/upload/file/pdf/v2/lcsc/2304140030_TDK-C1608X5R1E225KTJ00N_C342993.pdf; ComponentLink2Description: JLCPCB Part URL; ComponentLink2URL: https://jlcpcb.com/partdetail/C342993; ComponentLink3Description: LCSC Part URL; ComponentLink3URL: https://lcsc.com/product-detail/Multilayer-Ceramic-Capacitors-MLCC---SMD-SMT_TDK-TDK-C1608X5R1E225KTJ00N_C342993.html
footprint CAP-0603 (0603 (1608M) Capacitor)
pins: 1, 2

## C1608X5R1E335KT000E
designator C?  Capacitance: 3.3uF  (hidden comment: *)
Capacitor, Ceramic (MLCC), 3.3uF, ±10%, 25V, X5R, ±10%, SMD 0603; Manufacturer: TDK; Manufacturer Part Number: C1608X5R1E335KT000E; Package Size: 0603; JLCPCB Basic Part: No; JLCPCB Part Number: C342962; Supplier 1: LCSC; Category: Capacitors - MLCC; Supplier Part Number 1: C342962; Tolerance: ±10%; Voltage Rating: 25V; Temperature Coefficient: X5R; RoHS: Yes; ComponentLink1Description: Datasheet; ComponentLink1URL: https://wmsc.lcsc.com/wmsc/upload/file/pdf/v2/lcsc/2304140030_TDK-C1608X5R1E335KT000E_C342962.pdf; ComponentLink2Description: JLCPCB Part URL; ComponentLink2URL: https://jlcpcb.com/partdetail/C342962; ComponentLink3Description: LCSC Part URL; ComponentLink3URL: https://lcsc.com/product-detail/Multilayer-Ceramic-Capacitors-MLCC---SMD-SMT_TDK-TDK-C1608X5R1E335KT000E_C342962.html
footprint CAP-0603 (0603 (1608M) Capacitor)
pins: 1, 2

## C1608X5R1E474KT000E
designator C?  Capacitance: 470nF  (hidden comment: *)
Capacitor, Ceramic (MLCC), 470nF, ±10%, 25V, X5R, ±10%, SMD 0603; Manufacturer: TDK; Manufacturer Part Number: C1608X5R1E474KT000E; Package Size: 0603; JLCPCB Basic Part: No; JLCPCB Part Number: C338004; Supplier 1: LCSC; Category: Capacitors - MLCC; Supplier Part Number 1: C338004; Tolerance: ±10%; Voltage Rating: 25V; Temperature Coefficient: X5R; RoHS: Yes; ComponentLink1Description: Datasheet; ComponentLink1URL: https://wmsc.lcsc.com/wmsc/upload/file/pdf/v2/lcsc/2304140030_TDK-C1608X5R1E474KT000E_C338004.pdf; ComponentLink2Description: JLCPCB Part URL; ComponentLink2URL: https://jlcpcb.com/partdetail/C338004; ComponentLink3Description: LCSC Part URL; ComponentLink3URL: https://lcsc.com/product-detail/Multilayer-Ceramic-Capacitors-MLCC---SMD-SMT_TDK-TDK-C1608X5R1E474KT000E_C338004.html
footprint CAP-0603 (0603 (1608M) Capacitor)
pins: 1, 2

## C1608X5R1E475K080AC
designator C?  Capacitance: 4.7uF  (hidden comment: *)
Capacitor, Ceramic (MLCC), 4.7uF, ±10%, 25V, X5R, ±10%, SMD 0603; Manufacturer: TDK; Manufacturer Part Number: C1608X5R1E475K080AC; Package Size: 0603; JLCPCB Basic Part: No; JLCPCB Part Number: C2167443; Supplier 1: LCSC; Category: Capacitors - MLCC; Supplier Part Number 1: C2167443; Tolerance: ±10%; Voltage Rating: 25V; Temperature Coefficient: X5R; RoHS: Yes; ComponentLink1Description: Datasheet; ComponentLink1URL: https://wmsc.lcsc.com/wmsc/upload/file/pdf/v2/lcsc/2304140030_TDK-C1608X5R1E475K080AC_C2167443.pdf; ComponentLink2Description: JLCPCB Part URL; ComponentLink2URL: https://jlcpcb.com/partdetail/C2167443; ComponentLink3Description: LCSC Part URL; ComponentLink3URL: https://lcsc.com/product-detail/Multilayer-Ceramic-Capacitors-MLCC---SMD-SMT_TDK-TDK-C1608X5R1E475K080AC_C2167443.html
footprint CAP-0603 (0603 (1608M) Capacitor)
pins: 1, 2

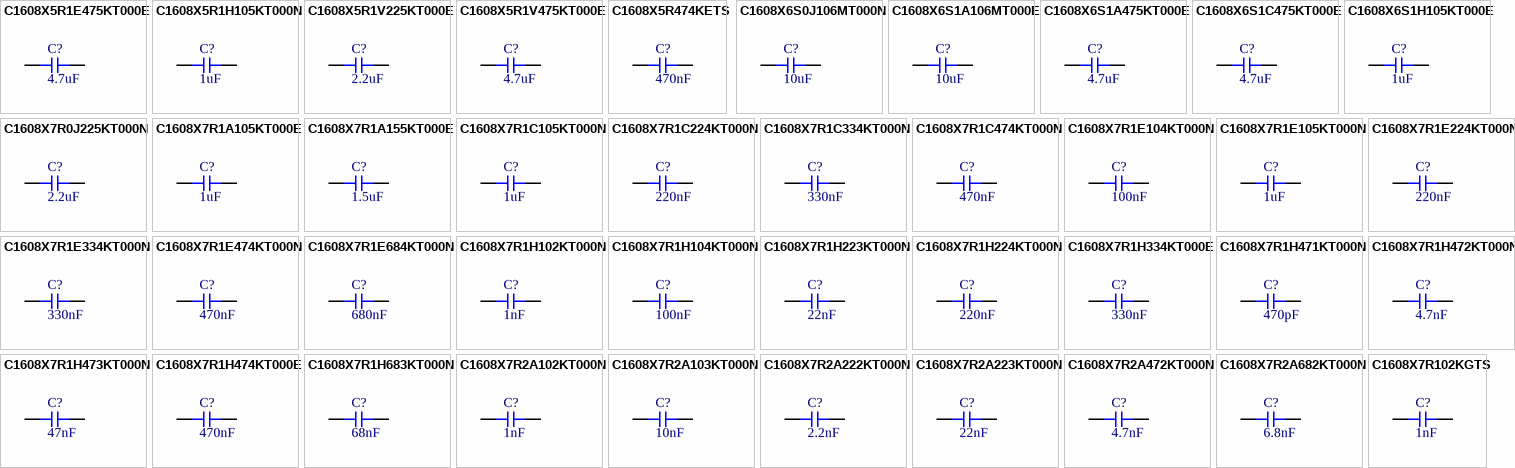
[diagram p32: symbols C1608X5R1E475KT000E to C1608X7R102KGTS]

## C1608X5R1E475KT000E
designator C?  Capacitance: 4.7uF  (hidden comment: *)
Capacitor, Ceramic (MLCC), 4.7uF, ±10%, 25V, X5R, ±10%, SMD 0603; Manufacturer: TDK; Manufacturer Part Number: C1608X5R1E475KT000E; Package Size: 0603; JLCPCB Basic Part: No; JLCPCB Part Number: C76615; Supplier 1: LCSC; Category: Capacitors - MLCC; Supplier Part Number 1: C76615; Tolerance: ±10%; Voltage Rating: 25V; Temperature Coefficient: X5R; RoHS: Yes; ComponentLink1Description: Datasheet; ComponentLink1URL: https://wmsc.lcsc.com/wmsc/upload/file/pdf/v2/lcsc/2304140030_TDK-C1608X5R1E475KT000E_C76615.pdf; ComponentLink2Description: JLCPCB Part URL; ComponentLink2URL: https://jlcpcb.com/partdetail/C76615; ComponentLink3Description: LCSC Part URL; ComponentLink3URL: https://lcsc.com/product-detail/Multilayer-Ceramic-Capacitors-MLCC---SMD-SMT_TDK-TDK-C1608X5R1E475KT000E_C76615.html
footprint CAP-0603 (0603 (1608M) Capacitor)
pins: 1, 2

## C1608X5R1H105KT000N
designator C?  Capacitance: 1uF  (hidden comment: *)
Capacitor, Ceramic (MLCC), 1uF, ±10%, 50V, X5R, ±10%, SMD 0603; Manufacturer: TDK; Manufacturer Part Number: C1608X5R1H105KT000N; Package Size: 0603; JLCPCB Basic Part: No; JLCPCB Part Number: C342988; Supplier 1: LCSC; Category: Capacitors - MLCC; Supplier Part Number 1: C342988; Tolerance: ±10%; Voltage Rating: 50V; Temperature Coefficient: X5R; RoHS: Yes; ComponentLink1Description: Datasheet; ComponentLink1URL: https://wmsc.lcsc.com/wmsc/upload/file/pdf/v2/lcsc/2304140030_TDK-C1608X5R1H105KT000N_C342988.pdf; ComponentLink2Description: JLCPCB Part URL; ComponentLink2URL: https://jlcpcb.com/partdetail/C342988; ComponentLink3Description: LCSC Part URL; ComponentLink3URL: https://lcsc.com/product-detail/Multilayer-Ceramic-Capacitors-MLCC---SMD-SMT_TDK-TDK-C1608X5R1H105KT000N_C342988.html
footprint CAP-0603 (0603 (1608M) Capacitor)
pins: 1, 2

## C1608X5R1V225KT000E
designator C?  Capacitance: 2.2uF  (hidden comment: *)
Capacitor, Ceramic (MLCC), 2.2uF, ±10%, 35V, X5R, ±10%, SMD 0603; Manufacturer: TDK; Manufacturer Part Number: C1608X5R1V225KT000E; Package Size: 0603; JLCPCB Basic Part: No; JLCPCB Part Number: C342978; Supplier 1: LCSC; Category: Capacitors - MLCC; Supplier Part Number 1: C342978; Tolerance: ±10%; Voltage Rating: 35V; Temperature Coefficient: X5R; RoHS: Yes; ComponentLink1Description: Datasheet; ComponentLink1URL: https://wmsc.lcsc.com/wmsc/upload/file/pdf/v2/lcsc/2304140030_TDK-C1608X5R1V225KT000E_C342978.pdf; ComponentLink2Description: JLCPCB Part URL; ComponentLink2URL: https://jlcpcb.com/partdetail/C342978; ComponentLink3Description: LCSC Part URL; ComponentLink3URL: https://lcsc.com/product-detail/Multilayer-Ceramic-Capacitors-MLCC---SMD-SMT_TDK-TDK-C1608X5R1V225KT000E_C342978.html
footprint CAP-0603 (0603 (1608M) Capacitor)
pins: 1, 2

## C1608X5R1V475KT000E
designator C?  Capacitance: 4.7uF  (hidden comment: *)
Capacitor, Ceramic (MLCC), 4.7uF, ±10%, 35V, X5R, ±10%, SMD 0603; Manufacturer: TDK; Manufacturer Part Number: C1608X5R1V475KT000E; Package Size: 0603; JLCPCB Basic Part: No; JLCPCB Part Number: C329940; Supplier 1: LCSC; Category: Capacitors - MLCC; Supplier Part Number 1: C329940; Tolerance: ±10%; Voltage Rating: 35V; Temperature Coefficient: X5R; RoHS: Yes; ComponentLink1Description: Datasheet; ComponentLink1URL: https://wmsc.lcsc.com/wmsc/upload/file/pdf/v2/lcsc/2304140030_TDK-C1608X5R1V475KT000E_C329940.pdf; ComponentLink2Description: JLCPCB Part URL; ComponentLink2URL: https://jlcpcb.com/partdetail/C329940; ComponentLink3Description: LCSC Part URL; ComponentLink3URL: https://lcsc.com/product-detail/Multilayer-Ceramic-Capacitors-MLCC---SMD-SMT_TDK-TDK-C1608X5R1V475KT000E_C329940.html
footprint CAP-0603 (0603 (1608M) Capacitor)
pins: 1, 2

## C1608X5R474KETS
designator C?  Capacitance: 470nF  (hidden comment: *)
Capacitor, Ceramic (MLCC), 470nF, ±10%, 16V, X5R, ±10%, SMD 0603; Manufacturer: Darfon Elec; Manufacturer Part Number: C1608X5R474KETS; Package Size: 0603; JLCPCB Basic Part: No; JLCPCB Part Number: C561178; Supplier 1: LCSC; Category: Capacitors - MLCC; Supplier Part Number 1: C561178; Tolerance: ±10%; Voltage Rating: 16V; Temperature Coefficient: X5R; RoHS: Yes; ComponentLink1Description: Datasheet; ComponentLink1URL: https://wmsc.lcsc.com/wmsc/upload/file/pdf/v2/lcsc/2006011904_Darfon-Elec-C1608X5R474KETS_C561178.pdf; ComponentLink2Description: JLCPCB Part URL; ComponentLink2URL: https://jlcpcb.com/partdetail/C561178; ComponentLink3Description: LCSC Part URL; ComponentLink3URL: https://lcsc.com/product-detail/Multilayer-Ceramic-Capacitors-MLCC---SMD-SMT_Darfon-Elec-Darfon-Elec-C1608X5R474KETS_C561178.html
footprint CAP-0603 (0603 (1608M) Capacitor)
pins: 1, 2

## C1608X6S0J106MT000N
designator C?  Capacitance: 10uF  (hidden comment: *)
Capacitor, Ceramic (MLCC), 10uF, ±20%, 6.3V, X6S, ±20%, SMD 0603; Manufacturer: TDK; Manufacturer Part Number: C1608X6S0J106MT000N; Package Size: 0603; JLCPCB Basic Part: No; JLCPCB Part Number: C342874; Supplier 1: LCSC; Category: Capacitors - MLCC; Supplier Part Number 1: C342874; Tolerance: ±20%; Voltage Rating: 6.3V; Temperature Coefficient: X6S; RoHS: Yes; ComponentLink1Description: Datasheet; ComponentLink1URL: https://wmsc.lcsc.com/wmsc/upload/file/pdf/v2/lcsc/2304140030_TDK-C1608X6S0J106MT000N_C342874.pdf; ComponentLink2Description: JLCPCB Part URL; ComponentLink2URL: https://jlcpcb.com/partdetail/C342874; ComponentLink3Description: LCSC Part URL; ComponentLink3URL: https://lcsc.com/product-detail/Multilayer-Ceramic-Capacitors-MLCC---SMD-SMT_TDK-TDK-C1608X6S0J106MT000N_C342874.html
footprint CAP-0603 (0603 (1608M) Capacitor)
pins: 1, 2

## C1608X6S1A106MT000E
designator C?  Capacitance: 10uF  (hidden comment: *)
Capacitor, Ceramic (MLCC), 10uF, ±20%, 10V, X6S, ±20%, SMD 0603; Manufacturer: TDK; Manufacturer Part Number: C1608X6S1A106MT000E; Package Size: 0603; JLCPCB Basic Part: No; JLCPCB Part Number: C342875; Supplier 1: LCSC; Category: Capacitors - MLCC; Supplier Part Number 1: C342875; Tolerance: ±20%; Voltage Rating: 10V; Temperature Coefficient: X6S; RoHS: Yes; ComponentLink1Description: Datasheet; ComponentLink1URL: https://wmsc.lcsc.com/wmsc/upload/file/pdf/v2/lcsc/2304140030_TDK-C1608X6S1A106MT000E_C342875.pdf; ComponentLink2Description: JLCPCB Part URL; ComponentLink2URL: https://jlcpcb.com/partdetail/C342875; ComponentLink3Description: LCSC Part URL; ComponentLink3URL: https://lcsc.com/product-detail/Multilayer-Ceramic-Capacitors-MLCC---SMD-SMT_TDK-TDK-C1608X6S1A106MT000E_C342875.html
footprint CAP-0603 (0603 (1608M) Capacitor)
pins: 1, 2

## C1608X6S1A475KT000E
designator C?  Capacitance: 4.7uF  (hidden comment: *)
Capacitor, Ceramic (MLCC), 4.7uF, ±10%, 10V, X6S, ±10%, SMD 0603; Manufacturer: TDK; Manufacturer Part Number: C1608X6S1A475KT000E; Package Size: 0603; JLCPCB Basic Part: No; JLCPCB Part Number: C342958; Supplier 1: LCSC; Category: Capacitors - MLCC; Supplier Part Number 1: C342958; Tolerance: ±10%; Voltage Rating: 10V; Temperature Coefficient: X6S; RoHS: Yes; ComponentLink1Description: Datasheet; ComponentLink1URL: https://wmsc.lcsc.com/wmsc/upload/file/pdf/v2/lcsc/2304140030_TDK-C1608X6S1A475KT000E_C342958.pdf; ComponentLink2Description: JLCPCB Part URL; ComponentLink2URL: https://jlcpcb.com/partdetail/C342958; ComponentLink3Description: LCSC Part URL; ComponentLink3URL: https://lcsc.com/product-detail/Multilayer-Ceramic-Capacitors-MLCC---SMD-SMT_TDK-TDK-C1608X6S1A475KT000E_C342958.html
footprint CAP-0603 (0603 (1608M) Capacitor)
pins: 1, 2

## C1608X6S1C475KT000E
designator C?  Capacitance: 4.7uF  (hidden comment: *)
Capacitor, Ceramic (MLCC), 4.7uF, ±10%, 16V, X6S, ±10%, SMD 0603; Manufacturer: TDK; Manufacturer Part Number: C1608X6S1C475KT000E; Package Size: 0603; JLCPCB Basic Part: No; JLCPCB Part Number: C342955; Supplier 1: LCSC; Category: Capacitors - MLCC; Supplier Part Number 1: C342955; Tolerance: ±10%; Voltage Rating: 16V; Temperature Coefficient: X6S; RoHS: Yes; ComponentLink1Description: Datasheet; ComponentLink1URL: https://wmsc.lcsc.com/wmsc/upload/file/pdf/v2/lcsc/2304140030_TDK-C1608X6S1C475KT000E_C342955.pdf; ComponentLink2Description: JLCPCB Part URL; ComponentLink2URL: https://jlcpcb.com/partdetail/C342955; ComponentLink3Description: LCSC Part URL; ComponentLink3URL: https://lcsc.com/product-detail/Multilayer-Ceramic-Capacitors-MLCC---SMD-SMT_TDK-TDK-C1608X6S1C475KT000E_C342955.html
footprint CAP-0603 (0603 (1608M) Capacitor)
pins: 1, 2